# Altium footprint library PCB_ConnectorHDR.PcbLib: 221 footprints (part 1 of 14)
Each footprint in its own frame and in the unit in brackets; x right, y up, seen from the top. Pads: shape width x height; smd on the part's side, far side on the other; paste and mask are expansions set on the pad; w line width, h text height; cw(c..) or ccw(c..) is an arc to the next point about the centre after c.
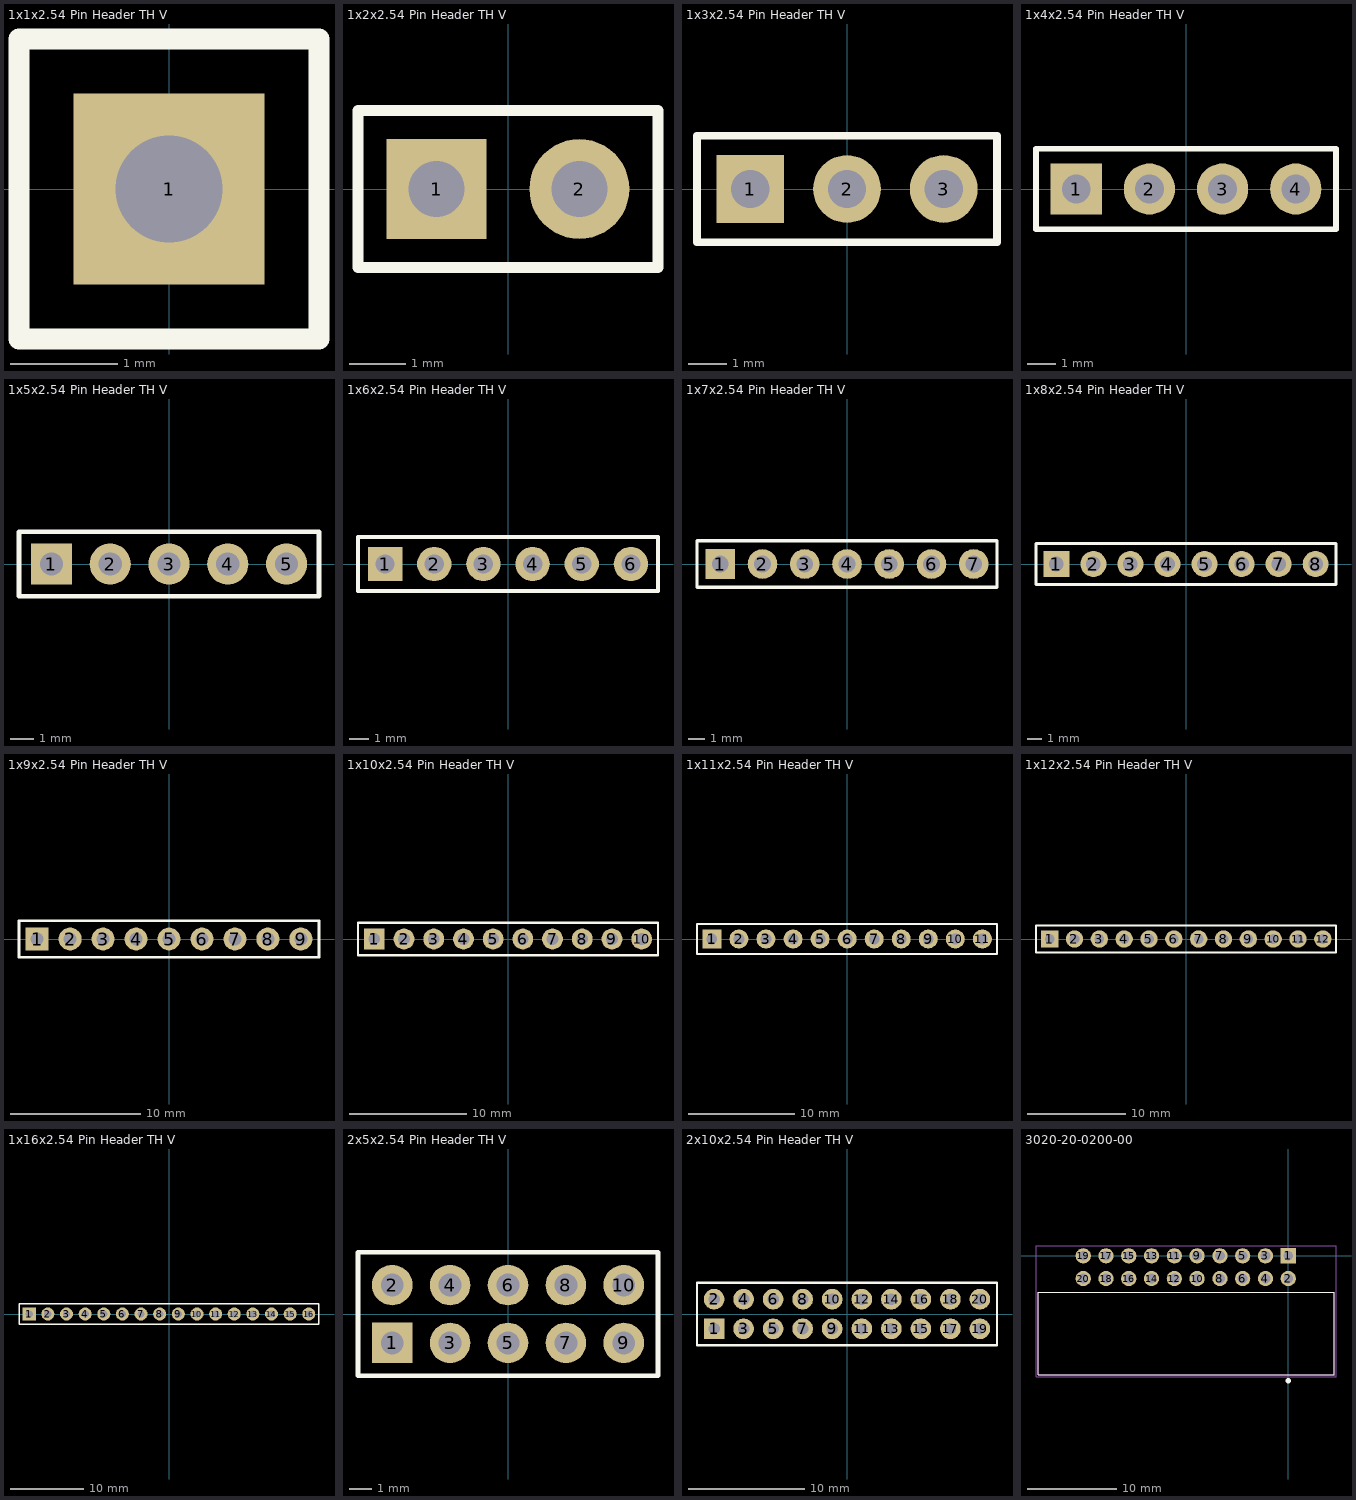
[diagram p0: the footprints below, top view; thin cyan lines are the x and y axes]

## 1x1x2.54 Pin Header TH V [mil] "1x1x2.54 Pin Header TH V"
height 336.22
pads (1):
  rect 70x70 hole 39.37: 1(0,0)
Top Overlay:
  lines w7.87: -55,-55 55,-55 55,55 -55,55 -55,-55
3D body "1x1x2.54 Pin Header TH V.STEP": height 336.42, standoff -117.91, extent -50,-50 50,50

## 1x2x2.54 Pin Header TH V [mil] "1x2x2.54 Pin Header TH V"
height 336.22
pads (2):
  rect 70x70 hole 39.37: 1(-50,0)
  round 70 hole 39.37: 2(50,0)
Top Overlay:
  lines w7.87: -105,-55 -105,55 105,55 105,-55 -105,-55
3D body "1x2x2.54 Pin Header TH  V.STEP": height 336.42, standoff -117.91, extent -99.99,-49.99 100.01,50.01

## 1x3x2.54 Pin Header TH V [mil] "1x3x2.54 Pin Header TH V"
height 336.22
pads (3):
  rect 70x70 hole 39.37: 1(-100,0)
  round 70 hole 39.37: 2(0,0) 3(100,0)
Top Overlay:
  lines w7.87: -155,-55 155,-55 155,55 -155,55 -155,-55
3D body "1x3x2.54 Pin Header TH  V.STEP": height 336.42, standoff -117.91, extent -149.99,-49.99 150.01,50.01

## 1x4x2.54 Pin Header TH V [mil] "1x4x2.54 Pin Header TH V"
height 336.22
pads (4):
  rect 70x70 hole 39.37: 1(-150,0)
  round 70 hole 39.37: 2(-50,0) 3(50,0) 4(150,0)
Top Overlay:
  lines w7.87: -205,-55 -205,55 205,55 205,-55 -205,-55
3D body "1x4x2.54 Pin Header TH  V.STEP": height 336.42, standoff -117.91, extent -199.99,-49.99 200.01,50.01

## 1x5x2.54 Pin Header TH V [mil] "1x5x2.54 Pin Header TH V"
height 336.22
pads (5):
  rect 70x70 hole 39.37: 1(-200,0)
  round 70 hole 39.37: 2(-100,0) 3(0,0) 4(100,0) 5(200,0)
Top Overlay:
  lines w7.87: -255,-55 255,-55 255,55 -255,55 -255,-55
3D body "1x5x2.54 Pin Header TH  V.STEP": height 336.42, standoff -117.91, extent -249.99,-49.99 250.01,50.01

## 1x6x2.54 Pin Header TH V [mil] "1x6x2.54 Pin Header TH V"
height 336.22
pads (6):
  rect 70x70 hole 39.37: 1(-250,0)
  round 70 hole 39.37: 2(-150,0) 3(-50,0) 4(50,0) 5(150,0) 6(250,0)
Top Overlay:
  lines w7.87: -305,-55 -305,55 305,55 305,-55 -305,-55
3D body "1x6x2.54 Pin Header TH  V.STEP": height 336.42, standoff -117.91, extent -299.99,-49.99 300.01,50.01

## 1x7x2.54 Pin Header TH V [mil] "1x7x2.54 Pin Header TH V"
height 336.22
pads (7):
  rect 70x70 hole 39.37: 1(-300,0)
  round 70 hole 39.37: 2(-200,0) 3(-100,0) 4(0,0) 5(100,0) 6(200,0) 7(300,0)
Top Overlay:
  lines w7.87: -355,-55 355,-55 355,55 -355,55 -355,-55
3D body "1x7x2.54 Pin Header TH  V.STEP": height 336.42, standoff -117.91, extent -349.99,-49.99 350.01,50.01

## 1x8x2.54 Pin Header TH V [mil] "1x8x2.54 Pin Header TH V"
height 336.22
pads (8):
  rect 70x70 hole 39.37: 1(-350,0)
  round 70 hole 39.37: 2(-250,0) 3(-150,0) 4(-50,0) 5(50,0) 6(150,0) 7(250,0) 8(350,0)
Top Overlay:
  lines w7.87: -405,-55 -405,55 405,55 405,-55 -405,-55
3D body "1x8x2.54 Pin Header TH  V.STEP": height 336.42, standoff -117.91, extent -399.99,-49.99 400.01,50.01

## 1x9x2.54 Pin Header TH V [mil] "1x9x2.54 Pin Header TH V"
height 336.22
pads (9):
  rect 70x70 hole 39.37: 1(-400,0)
  round 70 hole 39.37: 2(-300,0) 3(-200,0) 4(-100,0) 5(0,0) 6(100,0) 7(200,0) 8(300,0) 9(400,0)
Top Overlay:
  lines w7.87: -455,-55 -455,55 455,55 455,-55 -455,-55
3D body "1x9x2.54 Pin Header TH  V.STEP": height 336.42, standoff -117.91, extent -449.99,-50 450.01,50

## 1x10x2.54 Pin Header TH V [mil] "1x10x2.54 Pin Header TH V"
height 336.22
pads (10):
  rect 70x70 hole 39.37: 1(-450,0)
  round 70 hole 39.37: 2(-350,0) 3(-250,0) 4(-150,0) 5(-50,0) 6(50,0) 7(150,0) 8(250,0) 9(350,0) 10(450,0)
Top Overlay:
  lines w7.87: -505,-55 505,-55 505,55 -505,55 -505,-55
3D body "1x10x2.54 Pin Header TH  V.STEP": height 336.42, standoff -117.91, extent -500,-50 500,50

## 1x11x2.54 Pin Header TH V [mil] "1x11x2.54 Pin Header TH V"
height 336.22
pads (11):
  rect 70x70 hole 39.37: 1(-500,0)
  round 70 hole 39.37: 2(-400,0) 3(-300,0) 4(-200,0) 5(-100,0) 6(0,0) 7(100,0) 8(200,0) 9(300,0) 10(400,0) 11(500,0)
Top Overlay:
  lines w7.87: -555,-55 -555,55 554,55 554,-55 -555,-55
3D body "1x11x2.54 Pin Header TH V.STEP": height 336.42, standoff -117.91, extent -550,-51 550,49

## 1x12x2.54 Pin Header TH V [mil] "1x12x2.54 Pin Header TH V"
height 336.22
pads (12):
  rect 70x70 hole 39.37: 1(-550,0)
  round 70 hole 39.37: 2(-450,0) 3(-350,0) 4(-250,0) 5(-150,0) 6(-50,0) 7(50,0) 8(150,0) 9(250,0) 10(350,0) 11(450,0) 12(550,0)
Top Overlay:
  lines w7.87: -605,-55 603,-55 603,55 -605,55 -605,-55
3D body "1x12x2.54 Pin Header TH V.STEP": height 336.42, standoff -117.91, extent -600,-51 600,49

## 1x16x2.54 Pin Header TH V [mil] "1x16x2.54 Pin Header TH V"
height 336.22
pads (16):
  rect 70x70 hole 39.37: 1(-750,0)
  round 70 hole 39.37: 2(-650,0) 3(-550,0) 4(-450,0) 5(-350,0) 6(-250,0) 7(-150,0) 8(-50,0) 9(50,0) 10(150,0) 11(250,0) 12(350,0) 13(450,0) 14(550,0) 15(650,0) 16(750,0)
Top Overlay:
  lines w7.87: -805,-55 -805,55 805,55 805,-55 -805,-55
3D body "1x16x2.54 Pin Header TH  V.STEP": height 336.42, standoff -117.91, extent -800,-50 800,50

## 2x5x2.54 Pin Header TH V [mil] "2x5x2.54 Pin Header TH V"
height 336.22
pads (10):
  rect 70x70 hole 39.37: 1(-200,-50)
  round 70 hole 39.37: 2(-200,50) 3(-100,-50) 4(-100,50) 5(0,-50) 6(0,50) 7(100,-50) 8(100,50) 9(200,-50) 10(200,50)
Top Overlay:
  lines w7.87: -259,-106.3 -259,106.3 259,106.3 259,-106.3 -259,-106.3
3D body "2x5x2.54 Pin Header TH V.STEP": height 336.42, standoff -117.91, extent -250,-100 250,100

## 2x10x2.54 Pin Header TH V [mil] "2x10x2.54 Pin Header TH V"
height 336.22
pads (20):
  rect 70x70 hole 39.37: 1(-450,-50)
  round 70 hole 39.37: 2(-450,50) 3(-350,-50) 4(-350,50) 5(-250,-50) 6(-250,50) 7(-150,-50) 8(-150,50) 9(-50,-50) 10(-50,50) 11(50,-50) 12(50,50) 13(150,-50) 14(150,50) 15(250,-50) 16(250,50) 17(350,-50) 18(350,50) 19(450,-50) 20(450,50)
Top Overlay:
  lines w7.87: -507.87,-106.3 507.87,-106.3 507.87,106.3 -507.87,106.3 -507.87,-106.3
3D body "2x10x2.54 Pin Header TH  V.STEP": height 336.42, standoff -117.91, extent -500,-100 500,100

## 3020-20-0200-00 [mm]
pads (20):
  rect 1.7x1.7 hole 1.1: 1(0,0)
  round 1.7 hole 1.1: 2(0,-2.54) 3(-2.54,0) 4(-2.54,-2.54) 5(-5.08,0) 6(-5.08,-2.54) 7(-7.62,0) 8(-7.62,-2.54) 9(-10.16,0) 10(-10.16,-2.54) 11(-12.7,0) 12(-12.7,-2.54) 13(-15.24,0) 14(-15.24,-2.54) 15(-17.78,0) 16(-17.78,-2.54) 17(-20.32,0) 18(-20.32,-2.54) 19(-22.86,0) 20(-22.86,-2.54)
Top Overlay:
  circle w0.3: c0,-13.925 r0.15
  lines w0.127: -27.882,-4.075 5.138,-4.075 5.138,-13.275 -27.882,-13.275 -27.882,-4.074
Mechanical 13:
  circle w0.3: c0,0 r0.15
  lines w0.127: -27.882,-13.275 -27.882,-4.075 5.138,-4.075 5.138,-13.275 -27.882,-13.275
B-Component:
  lines w0.05: -28.125,-13.5 -28.125,1.1 5.325,1.1 5.325,-13.5 -28.125,-13.5
3D body "3020-20-0200-00 3D.STEP": height 9.62, standoff -2.85, extent -27.887,-13.227 5.133,0.272